# Altium footprint library ICs And Semiconductors SMD.PcbLib: 943 footprints (part 56 of 60)
Each footprint in its own frame and in the unit in brackets; x right, y up, seen from the top. Pads: shape width x height; smd on the part's side, far side on the other; paste and mask are expansions set on the pad; w line width, h text height; cw(c..) or ccw(c..) is an arc to the next point about the centre after c.
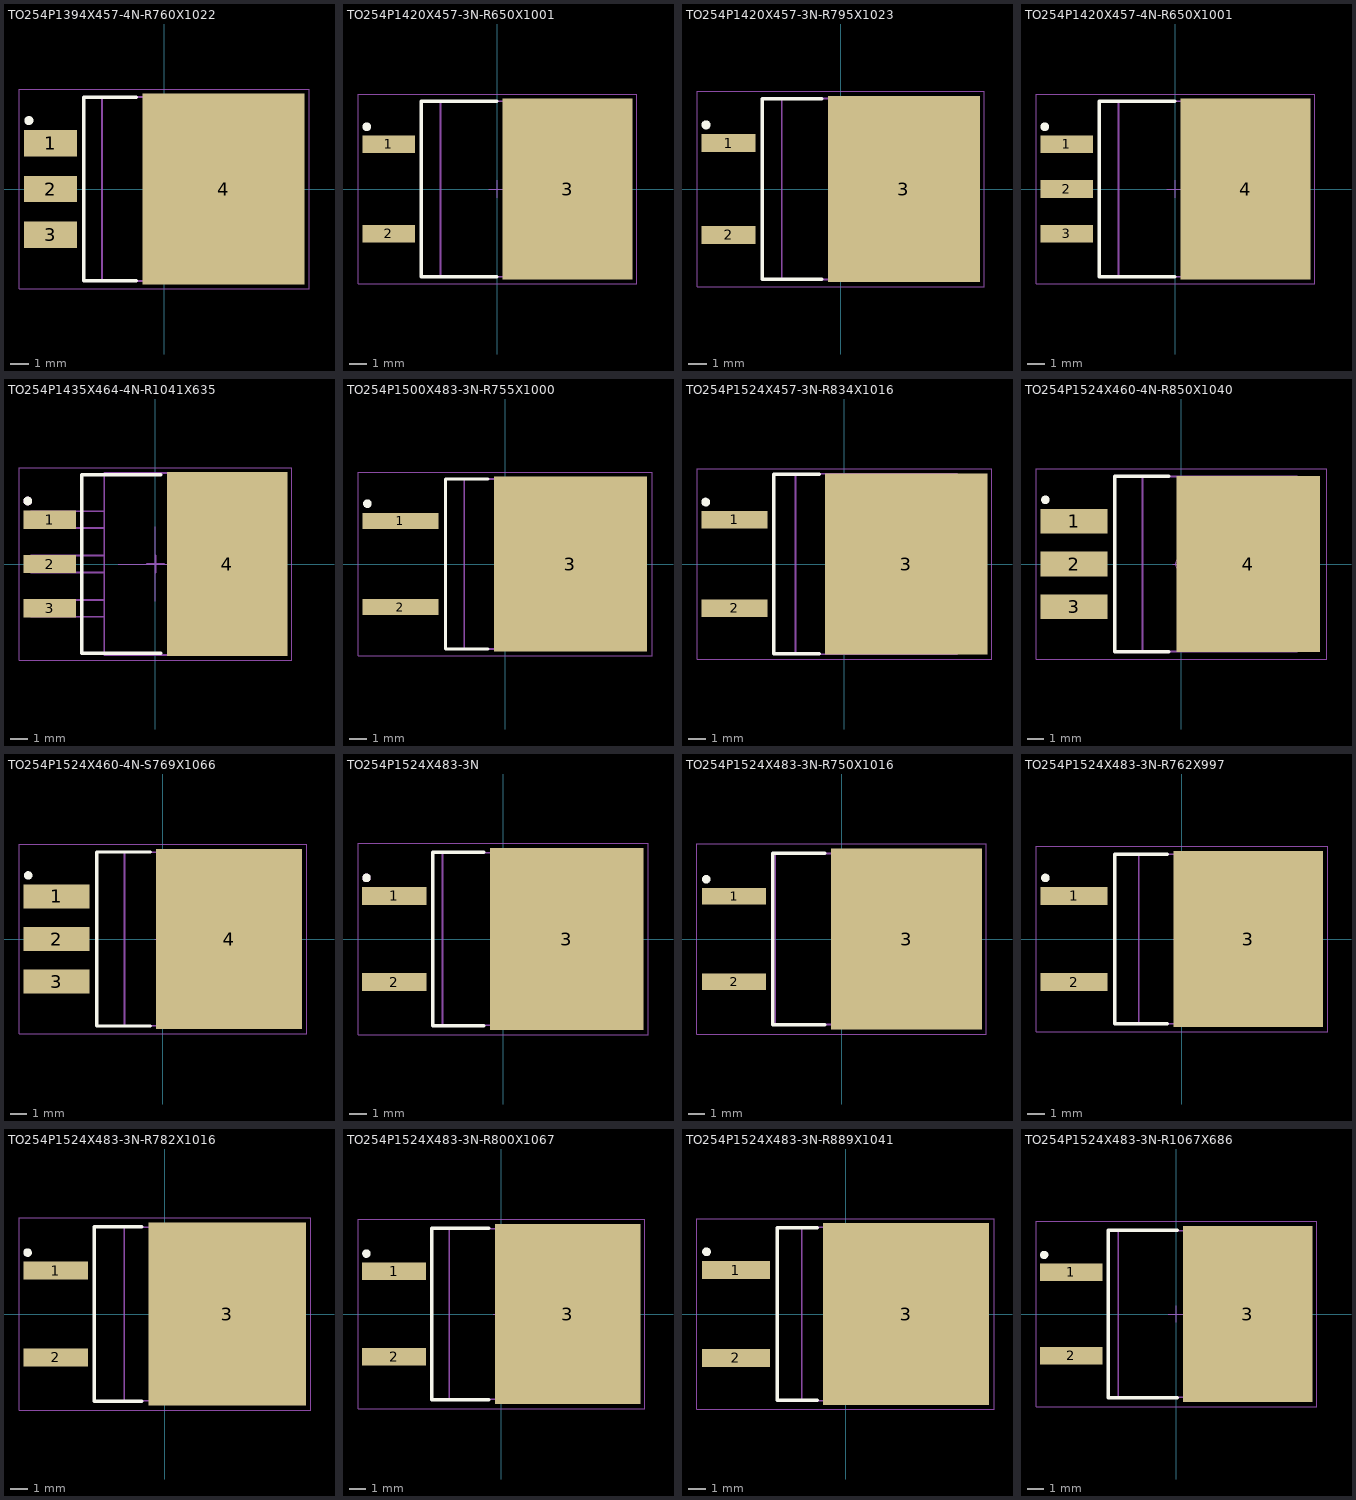
[diagram p55: the footprints below, top view; thin cyan lines are the x and y axes]

## TO254P1394X457-4N-R760X1022 [mm] "D2PAK TO-263, TO, 2.54mm pitch; 3 pin, 13.945mm L X 8.89mm W X 4.57mm H body, IPC Medium Density"
height 4.57
pads (4):
  rect 2.95x1.45 smd: 1(-6.3,2.54) 2(-6.3,0) 3(-6.3,-2.54)
  rect 9x10.6 smd: 4(3.3,0)
Top Overlay:
  circle w0.25: c-7.5,3.8 r0.125
  lines w0.2: -1.55,-5.1 -4.45,-5.1 -4.45,5.1 -1.55,5.1
Top Paste:
  region: -0.5,-4.7 0.86,-4.7 0.86,-3.3 -0.5,-3.3
  region: 1.58,-4.7 2.94,-4.7 2.94,-3.3 1.58,-3.3
  region: 3.66,-4.7 5.02,-4.7 5.02,-3.3 3.66,-3.3
  region: 5.74,-4.7 7.1,-4.7 7.1,-3.3 5.74,-3.3
  region: -0.5,-2.7 0.86,-2.7 0.86,-1.3 -0.5,-1.3
  region: 1.58,-2.7 2.94,-2.7 2.94,-1.3 1.58,-1.3
  region: 3.66,-2.7 5.02,-2.7 5.02,-1.3 3.66,-1.3
  region: 5.74,-2.7 7.1,-2.7 7.1,-1.3 5.74,-1.3
  region: -0.5,-0.7 0.86,-0.7 0.86,0.7 -0.5,0.7
  region: 1.58,-0.7 2.94,-0.7 2.94,0.7 1.58,0.7
  region: 3.66,-0.7 5.02,-0.7 5.02,0.7 3.66,0.7
  region: 5.74,-0.7 7.1,-0.7 7.1,0.7 5.74,0.7
  region: -0.5,1.3 0.86,1.3 0.86,2.7 -0.5,2.7
  region: 1.58,1.3 2.94,1.3 2.94,2.7 1.58,2.7
  region: 3.66,1.3 5.02,1.3 5.02,2.7 3.66,2.7
  region: 5.74,1.3 7.1,1.3 7.1,2.7 5.74,2.7
  region: -0.5,3.3 0.86,3.3 0.86,4.7 -0.5,4.7
  region: 1.58,3.3 2.94,3.3 2.94,4.7 1.58,4.7
  region: 3.66,3.3 5.02,3.3 5.02,4.7 3.66,4.7
  region: 5.74,3.3 7.1,3.3 7.1,4.7 5.74,4.7
Mechanical 14:
  lines w0.1: 5.452,-5.11 5.954,-5.11 6.972,-3.982 6.972,3.982 5.954,5.11 5.452,5.11 ; -3.438,-5.11 -3.438,5.11 5.453,5.11 5.453,-5.11 -3.438,-5.11
Mechanical 15:
  lines w0.05: -0.5,0 0.5,0 ; 0,-0.5 0,0.5 ; -8.05,-5.55 -8.05,5.55 8.05,5.55 8.05,-5.55 -8.05,-5.55
3D body "TO254P1524X483-3N.stp": height 4.83, standoff 0, extent -7.622,-5.08 7.623,5.08

## TO254P1420X457-3N-R650X1001 [mm] "D2PAK TO-263A, TO,2.54mm pitch; 2 pin, 14.195mm L X 9.195mm W X 4.57mm H body , IPC Medium Density"
height 4.57
pads (3):
  rect 3x1 smd: 1(-6.2,2.54) 2(-6.2,-2.54)
  rect 7.4x10.3 smd: 3(4,0)
Top Overlay:
  circle w0.25: c-7.45,3.55 r0.125
  lines w0.2: -0.05,-5 -4.35,-5 -4.35,5 -0.05,5
Top Paste:
  region: 5.49,2.71 6.91,2.71 6.91,4.49 5.49,4.49
  region: 3.29,2.71 4.71,2.71 4.71,4.49 3.29,4.49
  region: 1.09,2.71 2.51,2.71 2.51,4.49 1.09,4.49
  region: 5.49,0.31 6.91,0.31 6.91,2.09 5.49,2.09
  region: 3.29,0.31 4.71,0.31 4.71,2.09 3.29,2.09
  region: 1.09,0.31 2.51,0.31 2.51,2.09 1.09,2.09
  region: 5.49,-2.09 6.91,-2.09 6.91,-0.31 5.49,-0.31
  region: 3.29,-2.09 4.71,-2.09 4.71,-0.31 3.29,-0.31
  region: 1.09,-2.09 2.51,-2.09 2.51,-0.31 1.09,-0.31
  region: 5.49,-4.49 6.91,-4.49 6.91,-2.71 5.49,-2.71
  region: 3.29,-4.49 4.71,-4.49 4.71,-2.71 3.29,-2.71
  region: 1.09,-4.49 2.51,-4.49 2.51,-2.71 1.09,-2.71
Mechanical 14:
  lines w0.1: 5.948,-5.008 -3.248,-5.008 -3.248,5.008 5.948,5.008 ; 5.948,-5.008 5.948,5.008 ; 5.948,-5.008 6.328,-5.008 7.098,-4.154 7.098,4.154 6.328,5.008 5.948,5.008
Mechanical 15:
  lines w0.05: -0.5,0 0.5,0 ; 0,-0.5 0,0.5 ; -7.95,-5.4 7.95,-5.4 7.95,5.4 -7.95,5.4 -7.95,-5.4
3D body "TO254P1524X483-3N.stp": height 4.83, standoff 0, extent -7.622,-5.08 7.623,5.08

## TO254P1420X457-3N-R795X1023 [mm] "D2PAK TO-263, TO, 2.54mm pitch; 3 pin, 14.199mm L X 9.195mm W X 4.57mm H body, IPC Medium Density"
height 4.57
pads (3):
  rect 3x1 smd: 1(-6.2,2.54) 2(-6.2,-2.54)
  rect 8.4x10.3 smd: 3(3.5,0)
Top Overlay:
  circle w0.25: c-7.45,3.55 r0.125
  lines w0.2: -1.05,-5 -4.35,-5 -4.35,5 -1.05,5
Top Paste:
  region: 5.17,2.74 6.83,2.74 6.83,4.46 5.17,4.46
  region: 2.67,2.74 4.33,2.74 4.33,4.46 2.67,4.46
  region: 0.17,2.74 1.83,2.74 1.83,4.46 0.17,4.46
  region: 5.17,0.34 6.83,0.34 6.83,2.06 5.17,2.06
  region: 2.67,0.34 4.33,0.34 4.33,2.06 2.67,2.06
  region: 0.17,0.34 1.83,0.34 1.83,2.06 0.17,2.06
  region: 5.17,-2.06 6.83,-2.06 6.83,-0.34 5.17,-0.34
  region: 2.67,-2.06 4.33,-2.06 4.33,-0.34 2.67,-0.34
  region: 0.17,-2.06 1.83,-2.06 1.83,-0.34 0.17,-0.34
  region: 5.17,-4.46 6.83,-4.46 6.83,-2.74 5.17,-2.74
  region: 2.67,-4.46 4.33,-4.46 4.33,-2.74 2.67,-2.74
  region: 0.17,-4.46 1.83,-4.46 1.83,-2.74 0.17,-2.74
Mechanical 14:
  lines w0.1: 5.93,-5.01 6.316,-5.01 7.1,-4.141 7.1,4.141 6.316,5.01 5.93,5.01 ; 5.929,-5.01 5.929,5.01 ; 5.929,-5.01 -3.265,-5.01 -3.265,5.01 5.929,5.01
Mechanical 15:
  circle w0.05: c0,0 r0.35
  lines w0.05: -0.5,0 0.5,0 ; 0,-0.5 0,0.5 ; -7.95,-5.4 -7.95,5.4 7.95,5.4 7.95,-5.4 -7.95,-5.4
3D body "TO254P1420X457-3N-R795X1023.stp": height 4.57, standoff 0, extent -7.36,-5.1 7.361,5.1

## TO254P1420X457-4N-R650X1001 [mm] "D2PAK TO-263A, TO,2.54mm pitch; 3 pin, 14.195mm L X 9.195mm W X 4.57mm H body , IPC Medium Density"
height 4.57
pads (4):
  rect 3x1 smd: 1(-6.2,2.54) 2(-6.2,0) 3(-6.2,-2.54)
  rect 7.4x10.3 smd: 4(4,0)
Top Overlay:
  circle w0.25: c-7.45,3.55 r0.125
  lines w0.2: -0.05,-5 -4.35,-5 -4.35,5 -0.05,5
Top Paste:
  region: 5.49,2.71 6.91,2.71 6.91,4.49 5.49,4.49
  region: 3.29,2.71 4.71,2.71 4.71,4.49 3.29,4.49
  region: 1.09,2.71 2.51,2.71 2.51,4.49 1.09,4.49
  region: 5.49,0.31 6.91,0.31 6.91,2.09 5.49,2.09
  region: 3.29,0.31 4.71,0.31 4.71,2.09 3.29,2.09
  region: 1.09,0.31 2.51,0.31 2.51,2.09 1.09,2.09
  region: 5.49,-2.09 6.91,-2.09 6.91,-0.31 5.49,-0.31
  region: 3.29,-2.09 4.71,-2.09 4.71,-0.31 3.29,-0.31
  region: 1.09,-2.09 2.51,-2.09 2.51,-0.31 1.09,-0.31
  region: 5.49,-4.49 6.91,-4.49 6.91,-2.71 5.49,-2.71
  region: 3.29,-4.49 4.71,-4.49 4.71,-2.71 3.29,-2.71
  region: 1.09,-4.49 2.51,-4.49 2.51,-2.71 1.09,-2.71
Mechanical 14:
  lines w0.1: 5.948,-5.008 -3.248,-5.008 -3.248,5.008 5.948,5.008 ; 5.948,-5.008 5.948,5.008 ; 5.948,-5.008 6.328,-5.008 7.098,-4.154 7.098,4.154 6.328,5.008 5.948,5.008
Mechanical 15:
  lines w0.05: -0.5,0 0.5,0 ; 0,-0.5 0,0.5 ; -7.95,-5.4 7.95,-5.4 7.95,5.4 -7.95,5.4 -7.95,-5.4
3D body "TO254P1524X483-3N.stp": height 4.83, standoff 0, extent -7.622,-5.08 7.623,5.08

## TO254P1435X464-4N-R1041X635 [mm] "TO-263, TO, 2.54mm pitch; 3 pin,14.35mm L X 8.64mm W X 4.64mm H body IPC Medium Density"
height 4.64
pads (4):
  rect 3x1.05 smd: 1(-6.05,2.54) 2(-6.05,0) 3(-6.05,-2.54)
  rect 6.9x10.5 smd: 4(4.1,0)
Top Overlay:
  circle w0.25: c-7.3,3.6 r0.125
  lines w0.2: 0.3,-5.1 -4.2,-5.1 -4.2,5.1 0.3,5.1
Top Paste:
  region: 5.51,3.25 6.81,3.25 6.81,4.75 5.51,4.75
  region: 3.45,3.25 4.75,3.25 4.75,4.75 3.45,4.75
  region: 1.39,3.25 2.69,3.25 2.69,4.75 1.39,4.75
  region: 5.51,1.25 6.81,1.25 6.81,2.75 5.51,2.75
  region: 3.45,1.25 4.75,1.25 4.75,2.75 3.45,2.75
  region: 1.39,1.25 2.69,1.25 2.69,2.75 1.39,2.75
  region: 5.51,-0.75 6.81,-0.75 6.81,0.75 5.51,0.75
  region: 3.45,-0.75 4.75,-0.75 4.75,0.75 3.45,0.75
  region: 1.39,-0.75 2.69,-0.75 2.69,0.75 1.39,0.75
  region: 5.51,-2.75 6.81,-2.75 6.81,-1.25 5.51,-1.25
  region: 3.45,-2.75 4.75,-2.75 4.75,-1.25 3.45,-1.25
  region: 1.39,-2.75 2.69,-2.75 2.69,-1.25 1.39,-1.25
  region: 5.51,-4.75 6.81,-4.75 6.81,-3.25 5.51,-3.25
  region: 3.45,-4.75 4.75,-4.75 4.75,-3.25 3.45,-3.25
  region: 1.39,-4.75 2.69,-4.75 2.69,-3.25 1.39,-3.25
Mechanical 8:
  lines w0.1: -0.5,0 0.5,0 ; 0,-0.5 0,0.5
Mechanical 14:
  circle w0.25: c-7.3,3.6 r0.125
  lines w0.1: 5.97,-5.205 5.97,5.205 ; 5.97,-5.205 7.24,-5.049 7.24,5.049 5.97,5.205 ; 5.97,-5.205 -2.92,-5.205 -2.92,5.205 5.97,5.205 ; -7.11,-3.02 -7.11,-2.06 -2.92,-2.06 -2.92,-3.02 -7.11,-3.02 ; -7.11,-0.48 -7.11,0.48 -2.92,0.48 -2.92,-0.48 -7.11,-0.48 ; -7.11,2.06 -7.11,3.02 -2.92,3.02 -2.92,2.06 -7.11,2.06
Mechanical 15:
  lines w0.05: -2.119,0 0,0 ; 0,-2.119 0,0 ; 0,2.119 0,0 ; 2.119,0 0,0 ; -7.8,-5.5 7.8,-5.5 7.8,5.5 -7.8,5.5 -7.8,-5.5
3D body "TO254P1435X464-4N-R1041X635.stp": height 4.64, standoff -0.01, extent -7.11,-5.205 7.24,5.205

## TO254P1500X483-3N-R755X1000 [mm] "D2PAK TO-263A, TO,2.54mm pitch;2 pin,15.00mm L X 9.20mm W X 4.83mm H body, IPC Medium Density"
height 4.83
pads (3):
  rect 4.45x0.95 smd: 1(-6.15,2.54) 2(-6.15,-2.54)
  rect 9x10.3 smd: 3(3.85,0)
Top Overlay:
  circle w0.25: c-8.1,3.55 r0.125
  lines w0.2: -1,-5 -3.5,-5 -3.5,5 -1,5
Top Paste:
  region: 6.26,2.75 7.62,2.75 7.62,4.45 6.26,4.45
  region: 4.2,2.75 5.56,2.75 5.56,4.45 4.2,4.45
  region: 2.14,2.75 3.5,2.75 3.5,4.45 2.14,4.45
  region: 0.08,2.75 1.44,2.75 1.44,4.45 0.08,4.45
  region: 6.26,0.35 7.62,0.35 7.62,2.05 6.26,2.05
  region: 4.2,0.35 5.56,0.35 5.56,2.05 4.2,2.05
  region: 2.14,0.35 3.5,0.35 3.5,2.05 2.14,2.05
  region: 0.08,0.35 1.44,0.35 1.44,2.05 0.08,2.05
  region: 6.26,-2.05 7.62,-2.05 7.62,-0.35 6.26,-0.35
  region: 4.2,-2.05 5.56,-2.05 5.56,-0.35 4.2,-0.35
  region: 2.14,-2.05 3.5,-2.05 3.5,-0.35 2.14,-0.35
  region: 0.08,-2.05 1.44,-2.05 1.44,-0.35 0.08,-0.35
  region: 6.26,-4.45 7.62,-4.45 7.62,-2.75 6.26,-2.75
  region: 4.2,-4.45 5.56,-4.45 5.56,-2.75 4.2,-2.75
  region: 2.14,-4.45 3.5,-4.45 3.5,-2.75 2.14,-2.75
  region: 0.08,-4.45 1.44,-4.45 1.44,-2.75 0.08,-2.75
Mechanical 14:
  lines w0.1: 6.8,-5 -2.4,-5 -2.4,5 6.8,5 ; 6.8,-5 6.8,5 ; 6.8,-5 7.031,-5 7.5,-4.48 7.5,4.48 7.031,5 6.8,5
Mechanical 15:
  lines w0.05: -0.5,0 0.5,0 ; 0,-0.5 0,0.5 ; -8.65,-5.4 8.65,-5.4 8.65,5.4 -8.65,5.4 -8.65,-5.4
3D body "TO254P1524X483-3N.stp": height 4.83, standoff 0, extent -7.622,-5.08 7.623,5.08

## TO254P1524X457-3N-R834X1016 [mm] "D2PAK TO-263A, TO,2.54mm pitch;2 pin,15.24mm L X 9.27mm W X 4.57mm H body, IPC Medium Density"
height 4.57
pads (3):
  rect 3.8x1 smd: 1(-6.3,2.54) 2(-6.3,-2.54)
  rect 9.3x10.4 smd: 3(3.55,0)
Top Overlay:
  circle w0.25: c-7.95,3.55 r0.125
  lines w0.2: -1.45,-5.15 -4.05,-5.15 -4.05,5.15 -1.45,5.15
Top Paste:
  region: 6.05,2.78 7.47,2.78 7.47,4.48 6.05,4.48
  region: 3.91,2.78 5.33,2.78 5.33,4.48 3.91,4.48
  region: 1.77,2.78 3.19,2.78 3.19,4.48 1.77,4.48
  region: -0.37,2.78 1.05,2.78 1.05,4.48 -0.37,4.48
  region: 6.05,0.36 7.47,0.36 7.47,2.06 6.05,2.06
  region: 3.91,0.36 5.33,0.36 5.33,2.06 3.91,2.06
  region: 1.77,0.36 3.19,0.36 3.19,2.06 1.77,2.06
  region: -0.37,0.36 1.05,0.36 1.05,2.06 -0.37,2.06
  region: 6.05,-2.06 7.47,-2.06 7.47,-0.36 6.05,-0.36
  region: 3.91,-2.06 5.33,-2.06 5.33,-0.36 3.91,-0.36
  region: 1.77,-2.06 3.19,-2.06 3.19,-0.36 1.77,-0.36
  region: -0.37,-2.06 1.05,-2.06 1.05,-0.36 -0.37,-0.36
  region: 6.05,-4.48 7.47,-4.48 7.47,-2.78 6.05,-2.78
  region: 3.91,-4.48 5.33,-4.48 5.33,-2.78 3.91,-2.78
  region: 1.77,-4.48 3.19,-4.48 3.19,-2.78 1.77,-2.78
  region: -0.37,-4.48 1.05,-4.48 1.05,-2.78 -0.37,-2.78
Mechanical 14:
  lines w0.1: 6.47,-5.08 6.85,-5.08 7.62,-4.226 7.62,4.226 6.85,5.08 6.47,5.08 ; -2.8,-5.17 6.47,-5.17 6.47,5.17 -2.8,5.17 -2.8,-5.17
Mechanical 15:
  lines w0.05: -0.5,0 0.5,0 ; 0,-0.5 0,0.5 ; -8.45,-5.45 8.45,-5.45 8.45,5.45 -8.45,5.45 -8.45,-5.45
3D body "TO254P1524X483-3N.stp": height 4.83, standoff 0, extent -7.622,-5.08 7.623,5.08

## TO254P1524X460-4N-R850X1040 [mm] "D2PAK TO-263, TO, 2.54mm Pitch; 3 Pin, 15.24mm L X 10.40mm W X 4.6mm H Body, IPC Medium Density"
height 4.6
pads (4):
  rect 3.95x1.45 smd: 1(-6.35,2.54) 2(-6.35,0) 3(-6.35,-2.54)
  rect 8.5x10.4 smd: 4(3.95,0)
Top Overlay:
  circle w0.25: c-8.05,3.8 r0.125
  lines w0.2: -0.75,-5.2 -3.95,-5.2 -3.95,5.2 -0.75,5.2
Top Paste:
  region: 6.3,3.32 7.6,3.32 7.6,4.76 6.3,4.76
  region: 4.3,3.32 5.6,3.32 5.6,4.76 4.3,4.76
  region: 2.3,3.32 3.6,3.32 3.6,4.76 2.3,4.76
  region: 0.3,3.32 1.6,3.32 1.6,4.76 0.3,4.76
  region: 6.3,1.3 7.6,1.3 7.6,2.74 6.3,2.74
  region: 4.3,1.3 5.6,1.3 5.6,2.74 4.3,2.74
  region: 2.3,1.3 3.6,1.3 3.6,2.74 2.3,2.74
  region: 0.3,1.3 1.6,1.3 1.6,2.74 0.3,2.74
  region: 6.3,-0.72 7.6,-0.72 7.6,0.72 6.3,0.72
  region: 4.3,-0.72 5.6,-0.72 5.6,0.72 4.3,0.72
  region: 2.3,-0.72 3.6,-0.72 3.6,0.72 2.3,0.72
  region: 0.3,-0.72 1.6,-0.72 1.6,0.72 0.3,0.72
  region: 6.3,-2.74 7.6,-2.74 7.6,-1.3 6.3,-1.3
  region: 4.3,-2.74 5.6,-2.74 5.6,-1.3 4.3,-1.3
  region: 2.3,-2.74 3.6,-2.74 3.6,-1.3 2.3,-1.3
  region: 0.3,-2.74 1.6,-2.74 1.6,-1.3 0.3,-1.3
  region: 6.3,-4.76 7.6,-4.76 7.6,-3.32 6.3,-3.32
  region: 4.3,-4.76 5.6,-4.76 5.6,-3.32 4.3,-3.32
  region: 2.3,-4.76 3.6,-4.76 3.6,-3.32 2.3,-3.32
  region: 0.3,-4.76 1.6,-4.76 1.6,-3.32 0.3,-3.32
Mechanical 14:
  lines w0.1: 6.477,-5.182 6.854,-5.182 7.62,-4.332 7.62,4.332 6.854,5.182 6.477,5.182 ; 6.477,-5.182 6.477,5.182 ; 6.477,-5.182 -2.299,-5.182 -2.299,5.182 6.477,5.182
Mechanical 15:
  circle w0.05: c0,0 r0.35
  lines w0.05: -0.5,0 0.5,0 ; 0,-0.5 0,0.5 ; -8.6,-5.65 -8.6,5.65 8.6,5.65 8.6,-5.65 -8.6,-5.65
3D body "TO254P1524X460-4N-S769X1066.stp": height 4.59, standoff 0, extent -7.935,-5.335 7.935,5.335

## TO254P1524X460-4N-S769X1066 [mm] "D2PAK TO-263, TO, 2.54mm Pitch; 3 Pin, 15.24mm L X 10.36mm W X 4.597mm H Body, IPC Medium Density"
height 4.6
pads (4):
  rect 3.95x1.45 smd: 1(-6.35,2.54) 2(-6.35,0) 3(-6.35,-2.54)
  rect 8.7x10.75 smd: 4(3.95,0)
Top Overlay:
  circle w0.25: c-8.05,3.8 r0.125
  lines w0.2: -0.75,-5.2 -3.95,-5.2 -3.95,5.2 -0.75,5.2
Top Paste:
  region: 6.3,3.32 7.6,3.32 7.6,4.76 6.3,4.76
  region: 4.3,3.32 5.6,3.32 5.6,4.76 4.3,4.76
  region: 2.3,3.32 3.6,3.32 3.6,4.76 2.3,4.76
  region: 0.3,3.32 1.6,3.32 1.6,4.76 0.3,4.76
  region: 6.3,1.3 7.6,1.3 7.6,2.74 6.3,2.74
  region: 4.3,1.3 5.6,1.3 5.6,2.74 4.3,2.74
  region: 2.3,1.3 3.6,1.3 3.6,2.74 2.3,2.74
  region: 0.3,1.3 1.6,1.3 1.6,2.74 0.3,2.74
  region: 6.3,-0.72 7.6,-0.72 7.6,0.72 6.3,0.72
  region: 4.3,-0.72 5.6,-0.72 5.6,0.72 4.3,0.72
  region: 2.3,-0.72 3.6,-0.72 3.6,0.72 2.3,0.72
  region: 0.3,-0.72 1.6,-0.72 1.6,0.72 0.3,0.72
  region: 6.3,-2.74 7.6,-2.74 7.6,-1.3 6.3,-1.3
  region: 4.3,-2.74 5.6,-2.74 5.6,-1.3 4.3,-1.3
  region: 2.3,-2.74 3.6,-2.74 3.6,-1.3 2.3,-1.3
  region: 0.3,-2.74 1.6,-2.74 1.6,-1.3 0.3,-1.3
  region: 6.3,-4.76 7.6,-4.76 7.6,-3.32 6.3,-3.32
  region: 4.3,-4.76 5.6,-4.76 5.6,-3.32 4.3,-3.32
  region: 2.3,-4.76 3.6,-4.76 3.6,-3.32 2.3,-3.32
  region: 0.3,-4.76 1.6,-4.76 1.6,-3.32 0.3,-3.32
Mechanical 14:
  lines w0.1: 6.477,-5.182 6.854,-5.182 7.62,-4.332 7.62,4.332 6.854,5.182 6.477,5.182 ; 6.477,-5.182 6.477,5.182 ; 6.477,-5.182 -2.299,-5.182 -2.299,5.182 6.477,5.182
Mechanical 15:
  circle w0.05: c0,0 r0.35
  lines w0.05: -0.5,0 0.5,0 ; 0,-0.5 0,0.5 ; -8.6,-5.65 -8.6,5.65 8.6,5.65 8.6,-5.65 -8.6,-5.65
3D body "TO254P1524X460-4N-S769X1066.stp": height 4.59, standoff 0, extent -7.935,-5.335 7.935,5.335

## TO254P1524X483-3N [mm] "D2PAK TO-263AB 3-Leads, Pitch 2.54mm - Body 15.24x9.51mm, IPC Medium Density"
height 4.83
pads (3):
  rect 3.8x1.05 smd: 1(-6.4,2.54) 2(-6.4,-2.54)
  rect 9.05x10.75 smd: 3(3.75,0)
Top Overlay:
  circle w0.25: c-8.05,3.6 r0.125
  lines w0.2: -1.15,-5.1 -4.15,-5.1 -4.15,5.1 -1.15,5.1
Top Paste:
  region: -0.05,-4.75 1.31,-4.75 1.31,-3.33 -0.05,-3.33
  region: 2.03,-4.75 3.39,-4.75 3.39,-3.33 2.03,-3.33
  region: 4.11,-4.75 5.47,-4.75 5.47,-3.33 4.11,-3.33
  region: 6.19,-4.75 7.55,-4.75 7.55,-3.33 6.19,-3.33
  region: -0.05,-2.73 1.31,-2.73 1.31,-1.31 -0.05,-1.31
  region: 2.03,-2.73 3.39,-2.73 3.39,-1.31 2.03,-1.31
  region: 4.11,-2.73 5.47,-2.73 5.47,-1.31 4.11,-1.31
  region: 6.19,-2.73 7.55,-2.73 7.55,-1.31 6.19,-1.31
  region: -0.05,-0.71 1.31,-0.71 1.31,0.71 -0.05,0.71
  region: 2.03,-0.71 3.39,-0.71 3.39,0.71 2.03,0.71
  region: 4.11,-0.71 5.47,-0.71 5.47,0.71 4.11,0.71
  region: 6.19,-0.71 7.55,-0.71 7.55,0.71 6.19,0.71
  region: -0.05,1.31 1.31,1.31 1.31,2.73 -0.05,2.73
  region: 2.03,1.31 3.39,1.31 3.39,2.73 2.03,2.73
  region: 4.11,1.31 5.47,1.31 5.47,2.73 4.11,2.73
  region: 6.19,1.31 7.55,1.31 7.55,2.73 6.19,2.73
  region: -0.05,3.33 1.31,3.33 1.31,4.75 -0.05,4.75
  region: 2.03,3.33 3.39,3.33 3.39,4.75 2.03,4.75
  region: 4.11,3.33 5.47,3.33 5.47,4.75 4.11,4.75
  region: 6.19,3.33 7.55,3.33 7.55,4.75 6.19,4.75
Mechanical 14:
  circle w0.25: c-8.05,3.6 r0.125
  lines w0.1: 5.942,-5.08 7.052,-5.08 7.622,-3.872 7.622,3.873 7.052,5.08 5.942,5.08 ; -3.573,-5.08 -3.573,5.08 5.943,5.08 5.943,-5.08 -3.573,-5.08
Mechanical 15:
  lines w0.05: -8.55,-5.65 -8.55,5.65 8.55,5.65 8.55,-5.65 -8.55,-5.65
3D body "TO254P1524X483-3N.stp": height 4.83, standoff 0, extent -7.622,-5.08 7.623,5.08

## TO254P1524X483-3N-R750X1016 [mm] "D2PAK TO-263A, TO, 2.54mm pitch; 2 pin, 15.24mm L X 10.425mm W X 4.83mm H body, IPC Medium Density"
height 4.83
pads (3):
  rect 3.8x1 smd: 1(-6.4,2.54) 2(-6.4,-2.54)
  rect 8.95x10.75 smd: 3(3.85,0)
Top Overlay:
  circle w0.25: c-8.05,3.55 r0.125
  lines w0.2: -1,-5.1 -4.1,-5.1 -4.1,5.1 -1,5.1
Top Paste:
  region: 0.09,-4.8 1.43,-4.8 1.43,-3.36 0.09,-3.36
  region: 2.15,-4.8 3.49,-4.8 3.49,-3.36 2.15,-3.36
  region: 4.21,-4.8 5.55,-4.8 5.55,-3.36 4.21,-3.36
  region: 6.27,-4.8 7.61,-4.8 7.61,-3.36 6.27,-3.36
  region: 0.09,-2.76 1.43,-2.76 1.43,-1.32 0.09,-1.32
  region: 2.15,-2.76 3.49,-2.76 3.49,-1.32 2.15,-1.32
  region: 4.21,-2.76 5.55,-2.76 5.55,-1.32 4.21,-1.32
  region: 6.27,-2.76 7.61,-2.76 7.61,-1.32 6.27,-1.32
  region: 0.09,-0.72 1.43,-0.72 1.43,0.72 0.09,0.72
  region: 2.15,-0.72 3.49,-0.72 3.49,0.72 2.15,0.72
  region: 4.21,-0.72 5.55,-0.72 5.55,0.72 4.21,0.72
  region: 6.27,-0.72 7.61,-0.72 7.61,0.72 6.27,0.72
  region: 0.09,1.32 1.43,1.32 1.43,2.76 0.09,2.76
  region: 2.15,1.32 3.49,1.32 3.49,2.76 2.15,2.76
  region: 4.21,1.32 5.55,1.32 5.55,2.76 4.21,2.76
  region: 6.27,1.32 7.61,1.32 7.61,2.76 6.27,2.76
  region: 0.09,3.36 1.43,3.36 1.43,4.8 0.09,4.8
  region: 2.15,3.36 3.49,3.36 3.49,4.8 2.15,4.8
  region: 4.21,3.36 5.55,3.36 5.55,4.8 4.21,4.8
  region: 6.27,3.36 7.61,3.36 7.61,4.8 6.27,4.8
Mechanical 14:
  lines w0.1: 6.48,-5.08 6.856,-5.08 7.62,-4.234 7.62,4.234 6.856,5.08 6.48,5.08 ; 6.48,-5.08 6.48,5.08 ; 6.48,-5.08 -3.945,-5.08 -3.945,5.08 6.48,5.08
Mechanical 15:
  lines w0.05: -0.5,0 0.5,0 ; 0,-0.5 0,0.5 ; -8.6,-5.65 -8.6,5.65 8.6,5.65 8.6,-5.65 -8.6,-5.65
3D body "TO254P1524X483-3N.stp": height 4.83, standoff 0, extent -7.622,-5.08 7.623,5.08

## TO254P1524X483-3N-R762X997 [mm] "D2PAK TO-263A TO, 2.54mm pitch; 2 pin, 15.245mm L X 9.145mm W X 4.83mm H body, IPC Medium Density"
height 4.83
pads (3):
  rect 3.95x1.05 smd: 1(-6.35,2.54) 2(-6.35,-2.54)
  rect 8.8x10.35 smd: 3(3.9,0)
Top Overlay:
  circle w0.25: c-8.05,3.6 r0.125
  lines w0.2: -0.85,-5 -3.95,-5 -3.95,5 -0.85,5
Top Paste:
  region: 6.27,2.77 7.59,2.77 7.59,4.49 6.27,4.49
  region: 4.25,2.77 5.57,2.77 5.57,4.49 4.25,4.49
  region: 2.23,2.77 3.55,2.77 3.55,4.49 2.23,4.49
  region: 0.21,2.77 1.53,2.77 1.53,4.49 0.21,4.49
  region: 6.27,0.35 7.59,0.35 7.59,2.07 6.27,2.07
  region: 4.25,0.35 5.57,0.35 5.57,2.07 4.25,2.07
  region: 2.23,0.35 3.55,0.35 3.55,2.07 2.23,2.07
  region: 0.21,0.35 1.53,0.35 1.53,2.07 0.21,2.07
  region: 6.27,-2.07 7.59,-2.07 7.59,-0.35 6.27,-0.35
  region: 4.25,-2.07 5.57,-2.07 5.57,-0.35 4.25,-0.35
  region: 2.23,-2.07 3.55,-2.07 3.55,-0.35 2.23,-0.35
  region: 0.21,-2.07 1.53,-2.07 1.53,-0.35 0.21,-0.35
  region: 6.27,-4.49 7.59,-4.49 7.59,-2.77 6.27,-2.77
  region: 4.25,-4.49 5.57,-4.49 5.57,-2.77 4.25,-2.77
  region: 2.23,-4.49 3.55,-4.49 3.55,-2.77 2.23,-2.77
  region: 0.21,-4.49 1.53,-4.49 1.53,-2.77 0.21,-2.77
Mechanical 14:
  lines w0.1: 6.602,-4.985 -2.542,-4.985 -2.542,4.985 6.602,4.985 ; 6.602,-4.985 6.602,4.985 ; 6.602,-4.985 6.94,-4.985 7.622,-4.228 7.622,4.228 6.94,4.985 6.602,4.985
Mechanical 15:
  lines w0.05: -0.5,0 0.5,0 ; 0,-0.5 0,0.5 ; -8.6,-5.45 8.6,-5.45 8.6,5.45 -8.6,5.45 -8.6,-5.45
3D body "TO254P1524X483-3N.stp": height 4.83, standoff 0, extent -7.622,-5.08 7.623,5.08

## TO254P1524X483-3N-R782X1016 [mm] "D2PAK TO-263A, TO, 2.54mm pitch; 2 pin, 15.245mm L X 9.015mm W X 4.83mm H body, IPC Medium Density"
height 4.83
pads (3):
  rect 3.8x1.05 smd: 1(-6.4,2.54) 2(-6.4,-2.54)
  rect 9.25x10.75 smd: 3(3.65,0)
Top Overlay:
  circle w0.25: c-8.05,3.6 r0.125
  lines w0.2: -1.35,-5.1 -4.15,-5.1 -4.15,5.1 -1.35,5.1
Top Paste:
  region: -0.23,-4.75 1.17,-4.75 1.17,-3.33 -0.23,-3.33
  region: 1.89,-4.75 3.29,-4.75 3.29,-3.33 1.89,-3.33
  region: 4.01,-4.75 5.41,-4.75 5.41,-3.33 4.01,-3.33
  region: 6.13,-4.75 7.53,-4.75 7.53,-3.33 6.13,-3.33
  region: -0.23,-2.73 1.17,-2.73 1.17,-1.31 -0.23,-1.31
  region: 1.89,-2.73 3.29,-2.73 3.29,-1.31 1.89,-1.31
  region: 4.01,-2.73 5.41,-2.73 5.41,-1.31 4.01,-1.31
  region: 6.13,-2.73 7.53,-2.73 7.53,-1.31 6.13,-1.31
  region: -0.23,-0.71 1.17,-0.71 1.17,0.71 -0.23,0.71
  region: 1.89,-0.71 3.29,-0.71 3.29,0.71 1.89,0.71
  region: 4.01,-0.71 5.41,-0.71 5.41,0.71 4.01,0.71
  region: 6.13,-0.71 7.53,-0.71 7.53,0.71 6.13,0.71
  region: -0.23,1.31 1.17,1.31 1.17,2.73 -0.23,2.73
  region: 1.89,1.31 3.29,1.31 3.29,2.73 1.89,2.73
  region: 4.01,1.31 5.41,1.31 5.41,2.73 4.01,2.73
  region: 6.13,1.31 7.53,1.31 7.53,2.73 6.13,2.73
  region: -0.23,3.33 1.17,3.33 1.17,4.75 -0.23,4.75
  region: 1.89,3.33 3.29,3.33 3.29,4.75 1.89,4.75
  region: 4.01,3.33 5.41,3.33 5.41,4.75 4.01,4.75
  region: 6.13,3.33 7.53,3.33 7.53,4.75 6.13,4.75
Mechanical 14:
  lines w0.1: 6.622,-5.08 6.952,-5.08 7.622,-4.338 7.622,4.338 6.952,5.08 6.622,5.08 ; -2.392,-5.08 -2.392,5.08 6.623,5.08 6.623,-5.08 -2.392,-5.08
Mechanical 15:
  lines w0.05: -0.5,0 0.5,0 ; 0,-0.5 0,0.5 ; -8.55,-5.65 -8.55,5.65 8.55,5.65 8.55,-5.65 -8.55,-5.65
3D body "TO254P1524X483-3N.stp": height 4.83, standoff 0, extent -7.622,-5.08 7.623,5.08

## TO254P1524X483-3N-R800X1067 [mm] "D2PAK TO-263AB, TO, 2.54mm pitch; 2 pin, 15.24mm L X 10.16mm W X 4.83mm H body, IPC Medium Density"
height 4.83
pads (3):
  rect 3.8x1.05 smd: 1(-6.4,2.54) 2(-6.4,-2.54)
  rect 8.65x10.75 smd: 3(3.95,0)
Top Overlay:
  circle w0.25: c-8.05,3.6 r0.125
  lines w0.2: -0.75,-5.1 -4.15,-5.1 -4.15,5.1 -0.75,5.1
Top Paste:
  region: 6.28,3.32 7.56,3.32 7.56,4.76 6.28,4.76
  region: 4.3,3.32 5.58,3.32 5.58,4.76 4.3,4.76
  region: 2.32,3.32 3.6,3.32 3.6,4.76 2.32,4.76
  region: 0.34,3.32 1.62,3.32 1.62,4.76 0.34,4.76
  region: 6.28,1.3 7.56,1.3 7.56,2.74 6.28,2.74
  region: 4.3,1.3 5.58,1.3 5.58,2.74 4.3,2.74
  region: 2.32,1.3 3.6,1.3 3.6,2.74 2.32,2.74
  region: 0.34,1.3 1.62,1.3 1.62,2.74 0.34,2.74
  region: 6.28,-0.72 7.56,-0.72 7.56,0.72 6.28,0.72
  region: 4.3,-0.72 5.58,-0.72 5.58,0.72 4.3,0.72
  region: 2.32,-0.72 3.6,-0.72 3.6,0.72 2.32,0.72
  region: 0.34,-0.72 1.62,-0.72 1.62,0.72 0.34,0.72
  region: 6.28,-2.74 7.56,-2.74 7.56,-1.3 6.28,-1.3
  region: 4.3,-2.74 5.58,-2.74 5.58,-1.3 4.3,-1.3
  region: 2.32,-2.74 3.6,-2.74 3.6,-1.3 2.32,-1.3
  region: 0.34,-2.74 1.62,-2.74 1.62,-1.3 0.34,-1.3
  region: 6.28,-4.76 7.56,-4.76 7.56,-3.32 6.28,-3.32
  region: 4.3,-4.76 5.58,-4.76 5.58,-3.32 4.3,-3.32
  region: 2.32,-4.76 3.6,-4.76 3.6,-3.32 2.32,-3.32
  region: 0.34,-4.76 1.62,-4.76 1.62,-3.32 0.34,-3.32
Mechanical 14:
  lines w0.1: 5.972,-5.08 6.518,-5.08 7.623,-3.855 7.623,3.855 6.518,5.08 5.972,5.08 ; 5.972,-5.08 5.972,5.08 ; 5.972,-5.08 -3.108,-5.08 -3.108,5.08 5.972,5.08
Mechanical 15:
  circle w0.05: c0,0 r0.35
  lines w0.05: -0.5,0 0.5,0 ; 0,-0.5 0,0.5 ; -8.55,-5.65 -8.55,5.65 8.55,5.65 8.55,-5.65 -8.55,-5.65
3D body "TO254P1524X483-3N-R800X1067.stp": height 4.83, standoff 0, extent -7.622,-5.08 7.623,5.08

## TO254P1524X483-3N-R889X1041 [mm] "D2PAK TO-263, TO, 2.54mm Pitch; 2 Pin, 15.245mm L X 9.145mm W X 4.83mm H Body, IPC Medium Density"
height 4.83
pads (3):
  rect 3.95x1.05 smd: 1(-6.35,2.54) 2(-6.35,-2.54)
  rect 9.6x10.5 smd: 3(3.5,0)
Top Overlay:
  circle w0.25: c-8.05,3.6 r0.125
  lines w0.2: -1.65,-5 -3.95,-5 -3.95,5 -1.65,5
Top Paste:
  region: 6.09,3.28 7.57,3.28 7.57,4.64 6.09,4.64
  region: 3.87,3.28 5.35,3.28 5.35,4.64 3.87,4.64
  region: 1.65,3.28 3.13,3.28 3.13,4.64 1.65,4.64
  region: -0.57,3.28 0.91,3.28 0.91,4.64 -0.57,4.64
  region: 6.09,1.3 7.57,1.3 7.57,2.66 6.09,2.66
  region: 3.87,1.3 5.35,1.3 5.35,2.66 3.87,2.66
  region: 1.65,1.3 3.13,1.3 3.13,2.66 1.65,2.66
  region: -0.57,1.3 0.91,1.3 0.91,2.66 -0.57,2.66
  region: 6.09,-0.68 7.57,-0.68 7.57,0.68 6.09,0.68
  region: 3.87,-0.68 5.35,-0.68 5.35,0.68 3.87,0.68
  region: 1.65,-0.68 3.13,-0.68 3.13,0.68 1.65,0.68
  region: -0.57,-0.68 0.91,-0.68 0.91,0.68 -0.57,0.68
  region: 6.09,-2.66 7.57,-2.66 7.57,-1.3 6.09,-1.3
  region: 3.87,-2.66 5.35,-2.66 5.35,-1.3 3.87,-1.3
  region: 1.65,-2.66 3.13,-2.66 3.13,-1.3 1.65,-1.3
  region: -0.57,-2.66 0.91,-2.66 0.91,-1.3 -0.57,-1.3
  region: 6.09,-4.64 7.57,-4.64 7.57,-3.28 6.09,-3.28
  region: 3.87,-4.64 5.35,-4.64 5.35,-3.28 3.87,-3.28
  region: 1.65,-4.64 3.13,-4.64 3.13,-3.28 1.65,-3.28
  region: -0.57,-4.64 0.91,-4.64 0.91,-3.28 -0.57,-3.28
Mechanical 14:
  lines w0.1: 6.602,-5.015 6.94,-5.015 7.622,-4.258 7.622,4.258 6.94,5.015 6.602,5.015 ; 6.602,-5.015 6.602,5.015 ; 6.602,-5.015 -2.542,-5.015 -2.542,5.015 6.602,5.015
Mechanical 15:
  circle w0.05: c0,0 r0.35
  lines w0.05: -0.5,0 0.5,0 ; 0,-0.5 0,0.5 ; -8.6,-5.5 -8.6,5.5 8.6,5.5 8.6,-5.5 -8.6,-5.5
3D body "TO254P1524X483-3N-R889X1041.stp": height 4.83, standoff 0, extent -7.622,-5.205 7.623,5.205

## TO254P1524X483-3N-R1067X686 [mm] "D2PAK TO-263AB TO, 2.54mm pitch; 2 pin, 15.245mm L X 9.515mm W X 4.83mm H body, IPC Medium Density"
height 4.83
pads (3):
  rect 3.8x1.05 smd: 1(-6.4,2.54) 2(-6.4,-2.54)
  rect 7.9x10.75 smd: 3(4.35,0)
Top Overlay:
  circle w0.25: c-8.05,3.6 r0.125
  lines w0.2: 0.05,-5.1 -4.15,-5.1 -4.15,5.1 0.05,5.1
Top Paste:
  region: 5.95,3.34 7.47,3.34 7.47,4.82 5.95,4.82
  region: 3.59,3.34 5.11,3.34 5.11,4.82 3.59,4.82
  region: 1.23,3.34 2.75,3.34 2.75,4.82 1.23,4.82
  region: 5.95,1.3 7.47,1.3 7.47,2.78 5.95,2.78
  region: 3.59,1.3 5.11,1.3 5.11,2.78 3.59,2.78
  region: 1.23,1.3 2.75,1.3 2.75,2.78 1.23,2.78
  region: 5.95,-0.74 7.47,-0.74 7.47,0.74 5.95,0.74
  region: 3.59,-0.74 5.11,-0.74 5.11,0.74 3.59,0.74
  region: 1.23,-0.74 2.75,-0.74 2.75,0.74 1.23,0.74
  region: 5.95,-2.78 7.47,-2.78 7.47,-1.3 5.95,-1.3
  region: 3.59,-2.78 5.11,-2.78 5.11,-1.3 3.59,-1.3
  region: 1.23,-2.78 2.75,-2.78 2.75,-1.3 1.23,-1.3
  region: 5.95,-4.82 7.47,-4.82 7.47,-3.34 5.95,-3.34
  region: 3.59,-4.82 5.11,-4.82 5.11,-3.34 3.59,-3.34
  region: 1.23,-4.82 2.75,-4.82 2.75,-3.34 1.23,-3.34
Mechanical 14:
  lines w0.1: 5.972,-5.08 -3.543,-5.08 -3.543,5.08 5.972,5.08 ; 5.972,-5.08 5.972,5.08 ; 5.972,-5.08 6.518,-5.08 7.623,-3.855 7.623,3.855 6.518,5.08 5.972,5.08
Mechanical 15:
  lines w0.05: -0.5,0 0.5,0 ; 0,-0.5 0,0.5 ; -8.55,-5.65 8.55,-5.65 8.55,5.65 -8.55,5.65 -8.55,-5.65
3D body "TO254P1524X483-3N-R1067X686.stp": height 4.83, standoff 0, extent -7.622,-5.08 7.623,5.08